# Altium footprint library 集大电协1.5.PcbLib: 273 footprints (part 16 of 18)
Each footprint in its own frame and in the unit in brackets; x right, y up, seen from the top. Pads: shape width x height; smd on the part's side, far side on the other; paste and mask are expansions set on the pad; w line width, h text height; cw(c..) or ccw(c..) is an arc to the next point about the centre after c.
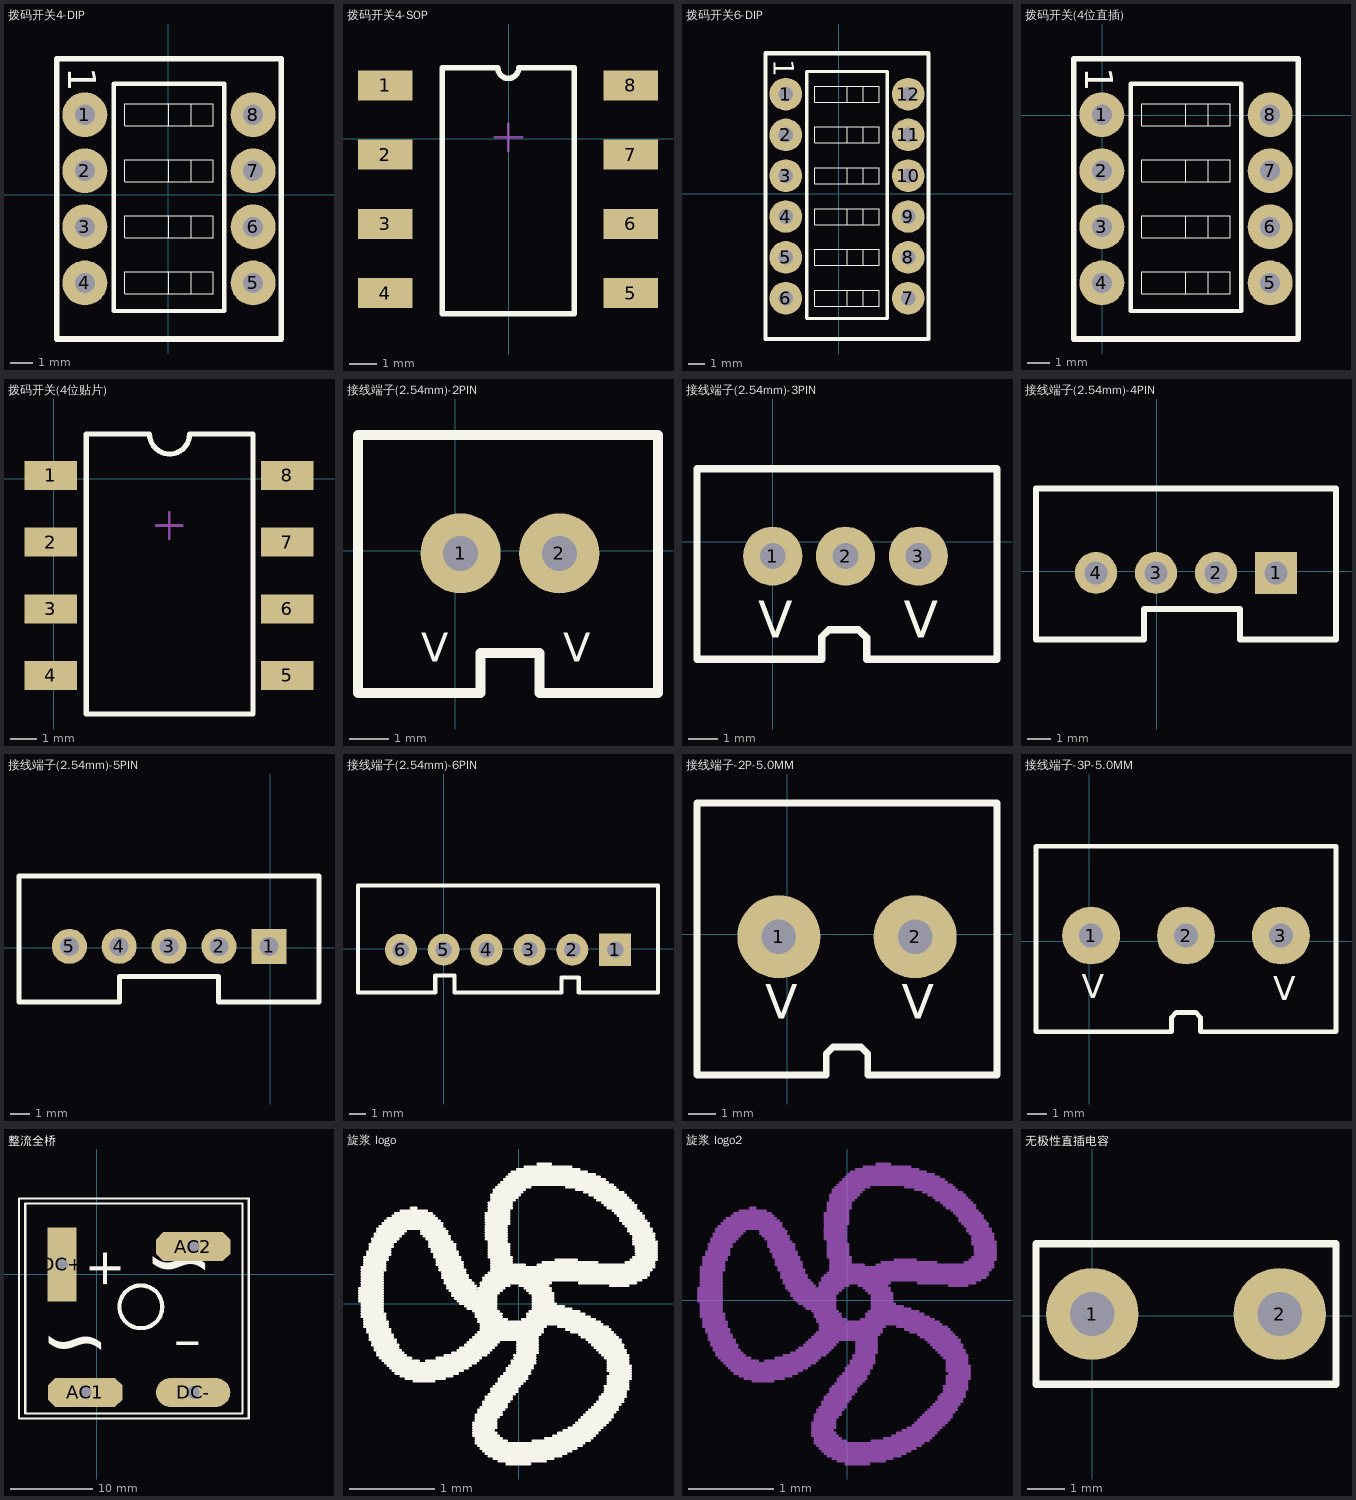
[diagram p15: the footprints below, top view; thin cyan lines are the x and y axes]

## 拨码开关4-DIP [mil]
pads (8):
  round 80 hole 36: 1(-148.7,142.5) 2(-148.7,42.5) 3(-148.7,-57.5) 4(-148.7,-157.5) 5(151.3,-157.5) 6(151.3,-57.5) 7(151.3,42.5) 8(151.3,142.5)
Top Overlay:
  lines w0.98: 1.3,-177.19 1.3,-137.82 ; 1.3,-77.19 1.3,-37.82 ; 1.3,22.81 1.3,62.18 ; 1.3,122.81 1.3,162.18 ; 40.67,-177.19 40.67,-137.82 ; 40.67,-77.19 40.67,-37.82 ; 40.67,22.81 40.67,62.18 ; 40.67,122.81 40.67,162.18 ; -77.44,-177.19 80.04,-177.19 80.04,-137.82 -77.44,-137.82 -77.44,-177.19 ; -77.44,-77.19 80.04,-77.19 80.04,-37.82 -77.44,-37.82 -77.44,-77.19 ; -77.44,22.81 80.04,22.81 80.04,62.18 -77.44,62.18 -77.44,22.81 ; -77.44,122.81 80.04,122.81 80.04,162.18 -77.44,162.18 -77.44,122.81
  lines w7.87: -97.13,-207.5 99.73,-207.5 99.73,197.62 -97.13,197.62 -97.13,-207.5
  lines w10: -198.7,-257.5 -198.7,242.5 201.3,242.5 201.3,-257.5 -198.7,-257.5
  text "1" at -178.7,227.5 h50
3D body: height 275.59, standoff -145.67, extent -195.47,-227.19 194.3,212.19

## 拨码开关4-SOP [mm]
pads (8):
  rect 2x1.1 smd: 1(-4.52,1.958) 2(-4.52,-0.582) 3(-4.52,-3.122) 4(-4.52,-5.662) 5(4.48,-5.662) 6(4.48,-3.122) 7(4.48,-0.582) 8(4.48,1.958)
Top Overlay:
  lines w0.203: -0.405,2.603 -2.423,2.603 -2.423,-6.424 2.403,-6.424 2.403,2.603 0.371,2.603 ; -0.391,2.593 ccw(c-0.01,2.593) 0.371,2.593
Mechanical 15:
  lines w0.1: -0.51,0.053 0.49,0.053 ; -0.01,-0.447 -0.01,0.553

## 拨码开关6-DIP [mil]
pads (12):
  round 80 hole 36: 1(-130.2,243.9) 2(-130.2,143.9) 3(-130.2,43.9) 4(-130.2,-56.1) 5(-130.2,-156.1) 6(-130.2,-256.1) 7(169.8,-256.1) 8(169.8,-156.1) 9(169.8,-56.1) 10(169.8,43.9) 11(169.8,143.9) 12(169.8,243.9)
Top Overlay:
  lines w0.98: 19.8,-275.79 19.8,-236.42 ; 19.8,-175.79 19.8,-136.42 ; 19.8,-75.79 19.8,-36.42 ; 19.8,24.21 19.8,63.58 ; 19.8,124.21 19.8,163.58 ; 19.8,224.21 19.8,263.58 ; 59.17,-275.79 59.17,-236.42 ; 59.17,-175.79 59.17,-136.42 ; 59.17,-75.79 59.17,-36.42 ; 59.17,24.21 59.17,63.58 ; 59.17,124.21 59.17,163.58 ; 59.17,224.21 59.17,263.58 ; -58.94,-275.79 -58.94,-236.42 98.54,-236.42 98.54,-275.79 -58.94,-275.79 ; -58.94,-175.79 -58.94,-136.42 98.54,-136.42 98.54,-175.79 -58.94,-175.79 ; -58.94,-75.79 -58.94,-36.42 98.54,-36.42 98.54,-75.79 -58.94,-75.79 ; -58.94,24.21 -58.94,63.58 98.54,63.58 98.54,24.21 -58.94,24.21 ; -58.94,124.21 -58.94,163.58 98.54,163.58 98.54,124.21 -58.94,124.21 ; -58.94,224.21 -58.94,263.58 98.54,263.58 98.54,224.21 -58.94,224.21
  lines w7.87: -78.63,-306.1 -78.63,299.02 118.23,299.02 118.23,-306.1 -78.63,-306.1
  lines w10: -180.2,-356.1 -180.2,343.9 219.8,343.9 219.8,-356.1 -180.2,-356.1
  text "1" at -160.2,328.9 h50
3D body: height 275.59, standoff -145.67, extent -177.2,-322.79 212.57,316.59

## 拨码开关(4位直插) [mil]
pads (8):
  round 80 hole 36: 1(-1,1) 2(-1,-99) 3(-1,-199) 4(-1,-299) 5(299,-299) 6(299,-199) 7(299,-99) 8(299,1)
Top Overlay:
  lines w0.98: 149,-318.69 149,-279.32 ; 149,-218.69 149,-179.32 ; 149,-118.69 149,-79.32 ; 149,-18.69 149,20.68 ; 188.37,-318.69 188.37,-279.32 ; 188.37,-218.69 188.37,-179.32 ; 188.37,-118.69 188.37,-79.32 ; 188.37,-18.69 188.37,20.68 ; 70.26,-318.69 227.74,-318.69 227.74,-279.32 70.26,-279.32 70.26,-318.69 ; 70.26,-218.69 227.74,-218.69 227.74,-179.32 70.26,-179.32 70.26,-218.69 ; 70.26,-118.69 227.74,-118.69 227.74,-79.32 70.26,-79.32 70.26,-118.69 ; 70.26,-18.69 227.74,-18.69 227.74,20.68 70.26,20.68 70.26,-18.69
  lines w7.87: 50.57,-349 247.43,-349 247.43,56.12 50.57,56.12 50.57,-349
  lines w10: -51,-399 -51,101 349,101 349,-399 -51,-399
  text "1" at -31,86 h50
3D body: height 275.59, standoff -145.67, extent -47.77,-368.69 342,70.69

## 拨码开关(4位贴片) [mm]
pads (8):
  rect 2x1.1 smd: 1(-0.103,0.121) 2(-0.103,-2.419) 3(-0.103,-4.959) 4(-0.103,-7.499) 5(8.897,-7.499) 6(8.897,-4.959) 7(8.897,-2.419) 8(8.897,0.121)
Top Overlay:
  lines w0.2: 1.245,-8.966 7.595,-8.966 7.595,1.702 5.182,1.702 cw(c4.42,1.702) 3.658,1.702 1.245,1.702 1.245,-8.966
Mechanical 15:
  lines w0.1: 3.907,-1.784 4.907,-1.784 ; 4.407,-2.284 4.407,-1.284
3D body: height 2, standoff 0, extent 0.991,-8.712 7.849,1.575
3D body: height 2.05, standoff 2, extent 2.388,-0.584 6.833,0.94
3D body: height 2.05, standoff 2, extent 2.388,-3.124 6.833,-1.6
3D body: height 2.05, standoff 2, extent 2.388,-5.664 6.833,-4.14
3D body: height 2.05, standoff 2, extent 2.388,-8.204 6.833,-6.68
3D body: height 2.15, standoff 2.05, extent 5.309,-0.584 6.833,0.94
3D body: height 2.15, standoff 2.05, extent 2.388,-3.124 3.912,-1.6
3D body: height 2.15, standoff 2.05, extent 5.309,-5.664 6.833,-4.14
3D body: height 2.15, standoff 2.05, extent 5.309,-8.204 6.833,-6.68

## 接线端子(2.54mm)-2PIN [mil]
pads (2):
  round 80 hole 35: 1(5.42,-2.44) 2(103.84,-2.44)
Top Overlay:
  lines w10: 141.42,-141.76 202.27,-141.76 202.27,115.67 -96.94,115.67 -96.94,-141.76 25.1,-141.76 25.1,-101.76 84.16,-101.76 84.16,-141.76 151.42,-141.76
  text "V" at 107.78,-120.55 h50
  text "V" at -33.95,-120.55 h50
3D body: height 459.84, standoff -140.16, extent -48.52,-139.05 151.48,110.95

## 接线端子(2.54mm)-3PIN [mil]
pads (3):
  round 80 hole 35: 1(0,-19.68) 2(98.43,-19.68) 3(196.85,-19.68)
Top Overlay:
  lines w10: 136,-159 303.15,-159 303.15,98.43 -102.36,98.43 -102.36,-159 66,-159 66,-129 76,-119 116,-119 127,-130 127,-159 146,-159
  text "V" at -19.68,-129.92 h50
  text "V" at 177.17,-129.92 h50
3D body: height 459.84, standoff -140.16, extent -51.57,-157.48 248.43,92.52

## 接线端子(2.54mm)-4PIN [mil]
pads (4):
  rect 70x70 hole 38: 1(199.11,-3)
  round 70 hole 38: 2(99.11,-3) 3(-0.89,-3) 4(-100.89,-3)
Top Overlay:
  lines w10: -200.89,-114.17 -20.89,-114.17 -20.89,-63 -0.89,-63 139.11,-63 139.11,-114.17 299.11,-114.17 299.11,137.8 -200.89,137.8 -200.89,-114.17
3D body: height 459.84, standoff -140.16, extent -148.82,-118.11 251.18,131.89

## 接线端子(2.54mm)-5PIN [mil]
pads (5):
  rect 70x70 hole 38: 1(-2.66,2.91)
  round 70 hole 38: 2(-102.66,2.91) 3(-202.66,2.91) 4(-302.66,2.91) 5(-402.07,2.91)
Top Overlay:
  lines w10: -502.95,-108.27 -302.17,-108.27 -302.17,-57.09 -202.66,-57.09 -103.35,-57.09 -103.35,-108.27 97.34,-108.27 97.34,143.7 -502.95,143.7 -502.95,-108.27
3D body: height 236.22, standoff -98.43, extent -493.11,-78.74 97.44,70.87

## 接线端子(2.54mm)-6PIN [mil]
pads (6):
  rect 75x75 hole 38: 1(399.35,-2.1)
  round 75 hole 38: 2(299.35,-2.1) 3(199.35,-2.1) 4(99.35,-2.1) 5(-0.65,-2.1) 6(-100.65,-2.1)
Top Overlay:
  lines w10: -200.65,-102.1 -200.65,147.9 499.35,147.9 499.35,-102.1 314.35,-102.1 314.35,-67.1 274.35,-67.1 274.35,-102.1 24.35,-102.1 24.35,-62.1 14.35,-62.1 -20.65,-62.1 -20.65,-102.1 -200.65,-102.1
3D body: height 236.22, standoff -78.74, extent -125.98,-74.8 425.2,102.36

## 接线端子-2P-5.0MM [mil]
pads (2):
  round 120 hole 50: 1(-11.81,-3.94) 2(185.04,-3.94)
Top Overlay:
  lines w10: -129.92,-203.31 56.61,-203.31 56.61,-173.31 66.61,-163.31 106.61,-163.31 116.61,-173.31 116.61,-203.31 136.61,-203.31 ; -129.92,-200.79 -129.92,188.98 303.15,188.98 303.15,-200.79 ; 126.61,-203.31 303.15,-203.31
  text "V" at -31.5,-122.05 h50
  text "V" at 165.35,-122.05 h50
3D body: height 433.07, standoff -78.74, extent -106.3,-153.54 287.4,161.42

## 接线端子-3P-5.0MM [mil]
pads (3):
  round 120 hole 50: 1(3.94,11.81) 2(200.79,11.81) 3(397.64,11.81)
Top Overlay:
  lines w10: -110.24,-187.56 -110.24,196.85 511.81,196.85 511.81,-187.56 230.79,-187.56 230.79,-157.56 220.79,-147.56 180.79,-147.56 170.79,-157.56 170.79,-187.56 -110.24,-187.56
  text "V" at 381.89,-122.05 h50
  text "V" at -15.75,-118.11 h50
3D body: height 433.07, standoff -78.74, extent -94.49,-153.54 496.06,161.42

## 整流全桥 [mm]
pads (4):
  oct 9x3.5 hole 1.5 square: AC1(-1.422,-14.326) AC2(11.659,3.327)
  rect 3.5x9 hole 1.5 square: DC+(-4.216,1.168)
  oval 9x3.5 hole 1.5 square: DC-(11.659,-14.326)
Top Overlay:
  circle w0.5: c5.334,-3.962 r2.587
  lines w0.254: -9.423,-17.501 18.39,-17.501 18.39,9.169 -9.423,9.169 -9.423,-17.501 ; -8.661,-16.866 17.628,-16.866 17.628,8.534 -8.661,8.534 -8.661,-16.866
  text "~" at 14.199,-4.293 h12.7
  text "~" at 1.626,-13.945 h12.7
  text "-" at 12.802,-13.31 h12.7
  text "+" at -2.311,-1.88 h7.62

## 旋浆 logo [mm]
Top Overlay:
  drawing of 310 lines, arcs and shapes, not listed

## 旋浆 logo2 [mm]
Bottom Overlay:
  drawing of 310 lines, arcs and shapes, not listed

## 无极性直插电容 [mm]
pads (2):
  round 2.5 hole 1.2: 1(0,0.051) 2(5.08,0.051)
Top Overlay:
  lines w0.2: -1.524,-1.854 -1.524,1.956 6.604,1.956 6.604,-1.854 -1.524,-1.854
3D body "User Library-Ceramic Disc Capacitor 0_2in pitch.STEP": height 7.06, standoff -1.44, extent -0.959,-0.797 6.04,0.899